# Altium footprint library Connectors.PcbLib: 73 footprints (part 5 of 5)
Each footprint in its own frame and in the unit in brackets; x right, y up, seen from the top. Pads: shape width x height; smd on the part's side, far side on the other; paste and mask are expansions set on the pad; w line width, h text height; cw(c..) or ccw(c..) is an arc to the next point about the centre after c.
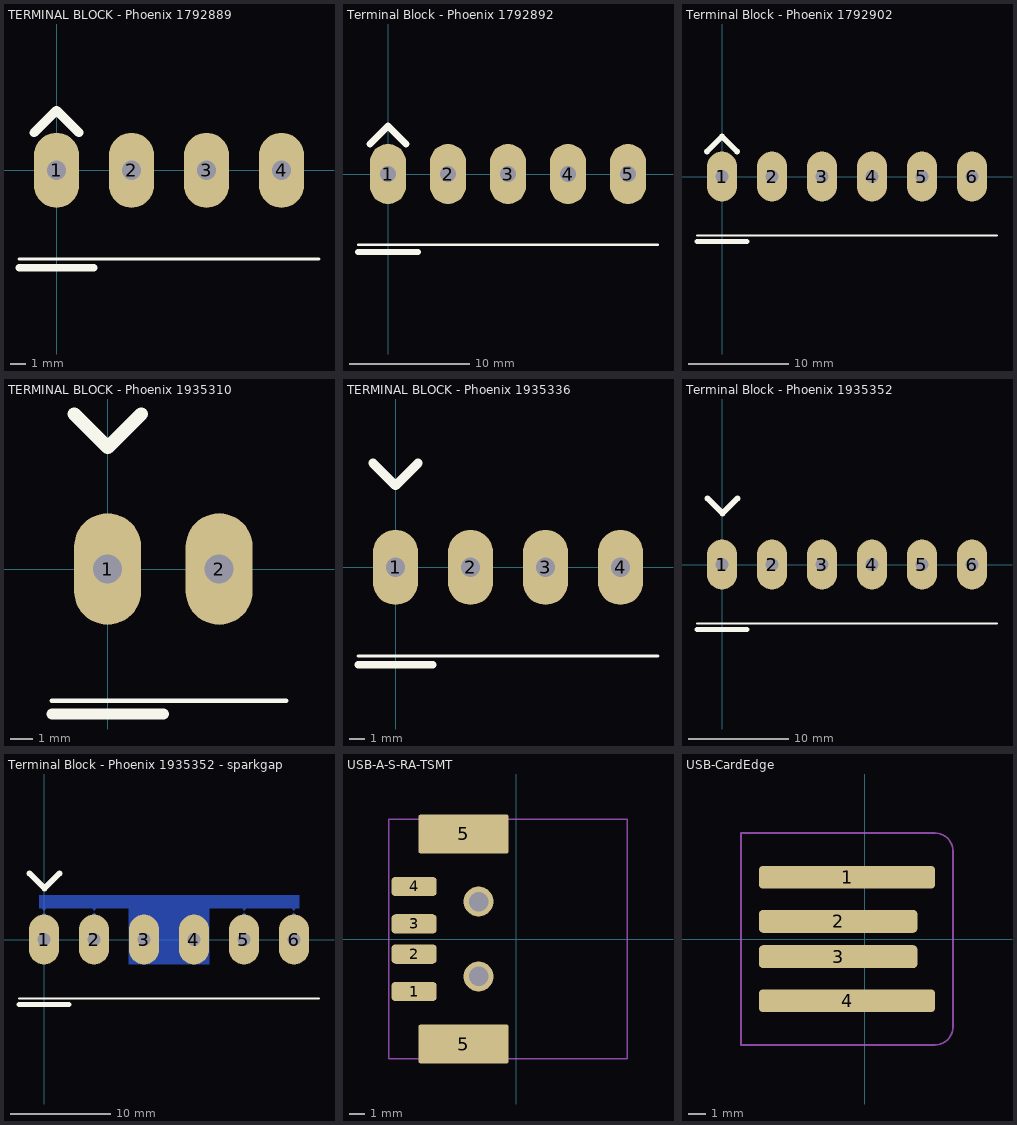
[diagram p4: the footprints below, top view; thin cyan lines are the x and y axes]

## TERMINAL BLOCK - Phoenix 1792889 [mm]
pads (4):
  oval 3x5 hole 1.3 paste-99: 1(0,0) 2(5,0) 3(10,0) 4(15,0)
Top Overlay:
  lines w0.2: -2.5,-5.9 17.5,-5.9
  lines w0.5: -2.5,-6.5 2.5,-6.5
  lines w0.6: -1.5,2.5 0,4 1.5,2.5
Assembly:
  text ".Designator" at 5.6,-0.2 h1.1
3D body "1792889.stp": height 13.72, standoff -2.38, extent -2.5,-5.55 17.5,4.95

## Terminal Block - Phoenix 1792892 [mm]
height 13.6
pads (5):
  oval 3x5 hole 1.3 paste-99: 1(0,0) 2(5,0) 3(10,0) 4(15,0) 5(20,0)
Top Overlay:
  lines w0.2: -2.5,-5.9 22.5,-5.9
  lines w0.5: -2.5,-6.5 2.5,-6.5
  lines w0.6: -1.5,2.5 0,4 1.5,2.5
Assembly:
  text ".Designator" at 7.6,-0.2 h1.1
3D body "1792892.stp": height 13.72, standoff -2.38, extent -2.5,-5.55 22.5,4.95

## Terminal Block - Phoenix 1792902 [mm]
height 13.6
pads (6):
  oval 3x5 hole 1.3 paste-99: 1(0,0) 2(5,0) 3(10,0) 4(15,0) 5(20,0) 6(25,0)
Top Overlay:
  lines w0.2: -2.5,-5.9 27.5,-5.9
  lines w0.5: -2.5,-6.5 2.5,-6.5
  lines w0.6: -1.5,2.5 0,4 1.5,2.5
Assembly:
  text ".Designator" at 9.6,-0.2 h1.1
3D body "1792902.stp": height 13.73, standoff -2.38, extent -2.5,-5.55 27.5,4.95

## TERMINAL BLOCK - Phoenix 1935310 [mm]
pads (2):
  oval 3x5 hole 1.3 paste-99: 1(0,0) 2(5,0)
Top Overlay:
  lines w0.2: -2.5,-5.9 8,-5.9
  lines w0.5: -2.5,-6.5 2.5,-6.5
  lines w0.6: -1.5,6.949 0,5.449 1.5,6.949
Assembly:
  text ".Designator" at 0.6,-0.2 h1.1
3D body "1935310.stp": height 9.33, standoff -3.17, extent -2.5,-5.397 8.07,6.003

## TERMINAL BLOCK - Phoenix 1935336 [mm]
pads (4):
  oval 3x5 hole 1.3 paste-99: 1(0,0) 2(5,0) 3(10,0) 4(15,0)
Top Overlay:
  lines w0.2: -2.5,-5.9 17.5,-5.9
  lines w0.5: -2.5,-6.5 2.5,-6.5
  lines w0.6: -1.5,6.949 0,5.449 1.5,6.949
Assembly:
  text ".Designator" at 5.6,-0.2 h1.1
3D body "1935336.stp": height 9.33, standoff -3.17, extent -2.5,-5.398 18.07,6.002

## Terminal Block - Phoenix 1935352 [mm]
height 13.6
pads (6):
  oval 3x5 hole 1.3 paste-99: 1(0,0) 2(5,0) 3(10,0) 4(15,0) 5(20,0) 6(25,0)
Top Overlay:
  lines w0.2: -2.5,-5.9 27.5,-5.9
  lines w0.5: -2.5,-6.5 2.5,-6.5
  lines w0.6: -1.449,6.619 0.051,5.119 1.551,6.619
Assembly:
  text ".Designator" at 10.6,-0.2 h1.1
3D body "1935352.stp": height 9.33, standoff -3.17, extent -2.5,-5.372 28.07,6.028

## Terminal Block - Phoenix 1935352 - sparkgap [mm]
height 13.6
pads (6):
  oval 3x5 hole 1.3: 1(0,0) 2(5,0) 3(10,0) 4(15,0) 5(20,0) 6(25,0)
Bottom Layer:
  rectangle: -0.508,3.124 25.527,4.445
  rectangle: 8.458,-2.515 16.535,3.124
  region: 0,2.692 -0.203,2.464 0.203,2.464
  region: 0,2.896 0.203,3.124 -0.203,3.124
  region: 5.004,2.896 5.207,3.124 4.801,3.124
  region: 5.004,2.692 4.801,2.464 5.207,2.464
  region: 20.015,2.896 20.218,3.124 19.812,3.124
  region: 20.015,2.692 19.812,2.464 20.218,2.464
  region: 24.994,2.896 25.197,3.124 24.79,3.124
  region: 24.994,2.692 24.79,2.464 25.197,2.464
Top Overlay:
  lines w0.2: -2.5,-5.9 27.5,-5.9
  lines w0.5: -2.5,-6.5 2.5,-6.5
  lines w0.6: -1.449,6.619 0.051,5.119 1.551,6.619
Bottom Solder:
  rectangle: 24.74,2.565 25.248,3.124
  rectangle: 19.761,2.565 20.269,3.124
  rectangle: 4.75,2.565 5.258,3.124
  rectangle: -0.254,2.565 0.254,3.124
Assembly:
  text ".Designator" at 10.6,-0.2 h1.1
3D body "1935352.stp": height 9.33, standoff -3.17, extent -2.5,-5.372 28.07,6.028

## USB-A-S-RA-TSMT [mm] "USB A 2.0, R/A, TRUE SMT, RECEPT"
pads (8):
  rrect40% 3x1.3 smd paste-0.08 mask+0.092: 1(-6.8,-3.5) 2(-6.8,-1) 3(-6.8,1) 4(-6.8,3.5)
  rrect10% 6x2.6 smd paste-0.4: 5(-3.5,-7) 5(-3.5,7)
  round 2 hole 1.3 paste-99: ""(-2.5,-2.5) ""(-2.5,2.5)
Assembly:
  lines w0.1: -8.5,-8 -8.5,8 7.425,8 7.425,-8 -8.5,-8
  text ".Designator" at -3.5,0 h1.1
3D body "CUI_DEVICES_UJ2-AH-1-SMT.step": height 7.6, standoff -0.8, extent -7.375,-7.95 7.425,7.95

## USB-CardEdge [mm] "USB A-type male connector, 2mm PCB thickness."
pads (4):
  rrect40% 10x1.3 smd paste-0.08 mask+0.092: 1(-1,3.5) 4(-1,-3.5)
  rrect40% 9x1.3 smd paste-0.08 mask+0.092: 2(-1.5,1) 3(-1.5,-1)
Assembly:
  lines w0.1: -7,-6 4,-6 ccw(c4,-5) 5,-5 5,5 ccw(c4,5) 4,6 -7,6 -7,-6